# Altium footprint library IC.PcbLib: 386 footprints (part 12 of 30)
Each footprint in its own frame and in the unit in brackets; x right, y up, seen from the top. Pads: shape width x height; smd on the part's side, far side on the other; paste and mask are expansions set on the pad; w line width, h text height; cw(c..) or ccw(c..) is an arc to the next point about the centre after c.
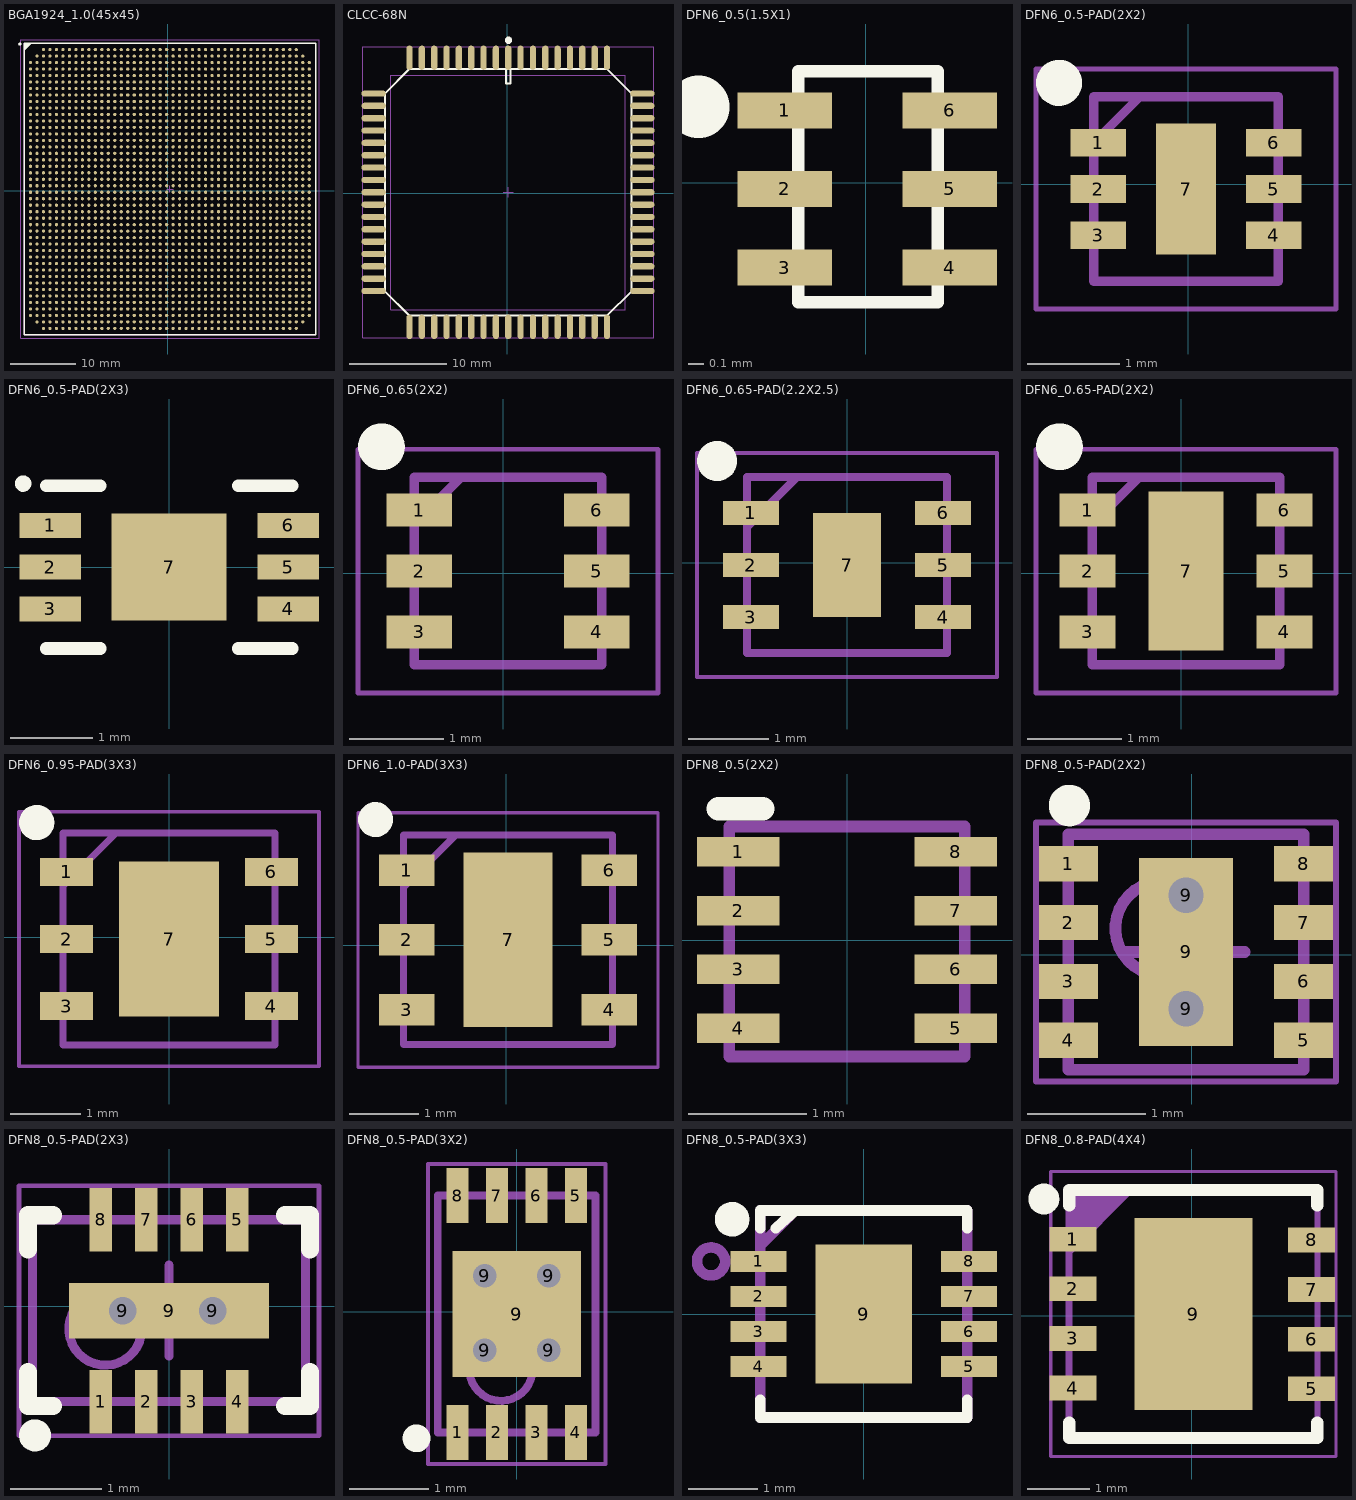
[diagram p11: the footprints below, top view; thin cyan lines are the x and y axes]

## BGA1924_1.0(45x45) [mm]
height 0.65
pads (1924):
  round 0.5 smd: A3(-19.195,21.779) A4(-18.195,21.779) A5(-17.195,21.779) A6(-16.195,21.779) A7(-15.195,21.779) A8(-14.195,21.779) A9(-13.195,21.779) A10(-12.195,21.779) A11(-11.195,21.779) A12(-10.195,21.779) A13(-9.195,21.779) A14(-8.195,21.779) A15(-7.195,21.779) A16(-6.195,21.779) A17(-5.195,21.779) A18(-4.195,21.779) A19(-3.195,21.779) A20(-2.195,21.779) A21(-1.195,21.779) A22(-0.195,21.779) A23(0.805,21.779) A24(1.805,21.779) A25(2.805,21.779) A26(3.805,21.779) A27(4.805,21.779) A28(5.805,21.779) A29(6.805,21.779) A30(7.805,21.779) A31(8.805,21.779) A32(9.805,21.779) A33(10.805,21.779) A34(11.805,21.779) A35(12.805,21.779) A36(13.805,21.779) A37(14.805,21.779) A38(15.805,21.779) A39(16.805,21.779) A40(17.805,21.779) A41(18.805,21.779) A42(19.805,21.779) AA1(-21.195,1.779) AA2(-20.195,1.779) AA3(-19.195,1.779) AA4(-18.195,1.779) AA5(-17.195,1.779) AA6(-16.195,1.779) AA7(-15.195,1.779) AA8(-14.195,1.779) AA9(-13.195,1.779) AA10(-12.195,1.779) AA11(-11.195,1.779) AA12(-10.195,1.779) AA13(-9.195,1.779) AA14(-8.195,1.779) AA15(-7.195,1.779) AA16(-6.195,1.779) AA17(-5.195,1.779) AA18(-4.195,1.779) AA19(-3.195,1.779) AA20(-2.195,1.779) AA21(-1.195,1.779) AA22(-0.195,1.779) AA23(0.805,1.779) AA24(1.805,1.779) AA25(2.805,1.779) AA26(3.805,1.779) AA27(4.805,1.779) AA28(5.805,1.779) AA29(6.805,1.779) AA30(7.805,1.779) AA31(8.805,1.779) AA32(9.805,1.779) AA33(10.805,1.779) AA34(11.805,1.779) AA35(12.805,1.779) AA36(13.805,1.779) AA37(14.805,1.779) AA38(15.805,1.779) AA39(16.805,1.779) AA40(17.805,1.779) AA41(18.805,1.779) AA42(19.805,1.779) AA43(20.805,1.779) AA44(21.805,1.779) AB1(-21.195,0.779) AB2(-20.195,0.779) AB3(-19.195,0.779) AB4(-18.195,0.779) AB5(-17.195,0.779) AB6(-16.195,0.779) AB7(-15.195,0.779) AB8(-14.195,0.779) AB9(-13.195,0.779) AB10(-12.195,0.779) AB11(-11.195,0.779) AB12(-10.195,0.779) AB13(-9.195,0.779) AB14(-8.195,0.779) AB15(-7.195,0.779) AB16(-6.195,0.779) AB17(-5.195,0.779) AB18(-4.195,0.779) AB19(-3.195,0.779) AB20(-2.195,0.779) AB21(-1.195,0.779) AB22(-0.195,0.779) AB23(0.805,0.779) AB24(1.805,0.779) AB25(2.805,0.779) AB26(3.805,0.779) AB27(4.805,0.779) AB28(5.805,0.779) AB29(6.805,0.779) AB30(7.805,0.779) AB31(8.805,0.779) AB32(9.805,0.779) AB33(10.805,0.779) AB34(11.805,0.779) AB35(12.805,0.779) AB36(13.805,0.779) AB37(14.805,0.779) AB38(15.805,0.779) AB39(16.805,0.779) AB40(17.805,0.779) AB41(18.805,0.779) AB42(19.805,0.779) AB43(20.805,0.779) AB44(21.805,0.779) AC1(-21.195,-0.221) AC2(-20.195,-0.221) AC3(-19.195,-0.221) AC4(-18.195,-0.221) AC5(-17.195,-0.221) AC6(-16.195,-0.221) AC7(-15.195,-0.221) AC8(-14.195,-0.221) AC9(-13.195,-0.221) AC10(-12.195,-0.221) AC11(-11.195,-0.221) AC12(-10.195,-0.221) AC13(-9.195,-0.221) AC14(-8.195,-0.221) AC15(-7.195,-0.221) AC16(-6.195,-0.221) AC17(-5.195,-0.221) AC18(-4.195,-0.221) AC19(-3.195,-0.221) AC20(-2.195,-0.221) AC21(-1.195,-0.221) AC22(-0.195,-0.221) AC23(0.805,-0.221) AC24(1.805,-0.221) AC25(2.805,-0.221) AC26(3.805,-0.221) AC27(4.805,-0.221) AC28(5.805,-0.221) AC29(6.805,-0.221) AC30(7.805,-0.221) AC31(8.805,-0.221) AC32(9.805,-0.221) AC33(10.805,-0.221) AC34(11.805,-0.221) AC35(12.805,-0.221) AC36(13.805,-0.221) AC37(14.805,-0.221) AC38(15.805,-0.221) AC39(16.805,-0.221) AC40(17.805,-0.221) AC41(18.805,-0.221) AC42(19.805,-0.221) AC43(20.805,-0.221) AC44(21.805,-0.221) AD1(-21.195,-1.221) AD2(-20.195,-1.221) AD3(-19.195,-1.221) AD4(-18.195,-1.221) AD5(-17.195,-1.221) AD6(-16.195,-1.221) AD7(-15.195,-1.221) AD8(-14.195,-1.221) AD9(-13.195,-1.221) AD10(-12.195,-1.221) AD11(-11.195,-1.221) AD12(-10.195,-1.221) AD13(-9.195,-1.221) AD14(-8.195,-1.221) AD15(-7.195,-1.221) AD16(-6.195,-1.221) AD17(-5.195,-1.221) AD18(-4.195,-1.221) AD19(-3.195,-1.221) AD20(-2.195,-1.221) AD21(-1.195,-1.221) AD22(-0.195,-1.221) AD23(0.805,-1.221) AD24(1.805,-1.221) AD25(2.805,-1.221) AD26(3.805,-1.221) AD27(4.805,-1.221) AD28(5.805,-1.221) AD29(6.805,-1.221) AD30(7.805,-1.221) AD31(8.805,-1.221) AD32(9.805,-1.221) AD33(10.805,-1.221) AD34(11.805,-1.221) AD35(12.805,-1.221) AD36(13.805,-1.221) AD37(14.805,-1.221) AD38(15.805,-1.221) AD39(16.805,-1.221) AD40(17.805,-1.221) AD41(18.805,-1.221) AD42(19.805,-1.221) AD43(20.805,-1.221) AD44(21.805,-1.221) AE1(-21.195,-2.221) AE2(-20.195,-2.221) AE3(-19.195,-2.221) AE4(-18.195,-2.221) AE5(-17.195,-2.221) AE6(-16.195,-2.221) AE7(-15.195,-2.221) AE8(-14.195,-2.221) AE9(-13.195,-2.221) AE10(-12.195,-2.221) AE11(-11.195,-2.221) AE12(-10.195,-2.221) AE13(-9.195,-2.221) AE14(-8.195,-2.221) AE15(-7.195,-2.221) AE16(-6.195,-2.221) AE17(-5.195,-2.221) AE18(-4.195,-2.221) AE19(-3.195,-2.221) AE20(-2.195,-2.221) AE21(-1.195,-2.221) AE22(-0.195,-2.221) AE23(0.805,-2.221) AE24(1.805,-2.221) AE25(2.805,-2.221) AE26(3.805,-2.221) AE27(4.805,-2.221) AE28(5.805,-2.221) AE29(6.805,-2.221) AE30(7.805,-2.221) AE31(8.805,-2.221) AE32(9.805,-2.221) AE33(10.805,-2.221) AE34(11.805,-2.221) AE35(12.805,-2.221) AE36(13.805,-2.221) AE37(14.805,-2.221) AE38(15.805,-2.221) AE39(16.805,-2.221) AE40(17.805,-2.221) AE41(18.805,-2.221) AE42(19.805,-2.221) AE43(20.805,-2.221) AE44(21.805,-2.221) AF1(-21.195,-3.221) AF2(-20.195,-3.221) AF3(-19.195,-3.221) AF4(-18.195,-3.221) AF5(-17.195,-3.221) AF6(-16.195,-3.221) AF7(-15.195,-3.221) AF8(-14.195,-3.221) AF9(-13.195,-3.221) AF10(-12.195,-3.221) AF11(-11.195,-3.221) AF12(-10.195,-3.221) AF13(-9.195,-3.221) AF14(-8.195,-3.221) AF15(-7.195,-3.221) AF16(-6.195,-3.221) AF17(-5.195,-3.221) AF18(-4.195,-3.221) AF19(-3.195,-3.221) AF20(-2.195,-3.221) AF21(-1.195,-3.221) AF22(-0.195,-3.221) AF23(0.805,-3.221) AF24(1.805,-3.221) AF25(2.805,-3.221) AF26(3.805,-3.221) AF27(4.805,-3.221) AF28(5.805,-3.221) AF29(6.805,-3.221) AF30(7.805,-3.221) AF31(8.805,-3.221) AF32(9.805,-3.221) AF33(10.805,-3.221) AF34(11.805,-3.221) AF35(12.805,-3.221) AF36(13.805,-3.221) AF37(14.805,-3.221) AF38(15.805,-3.221) AF39(16.805,-3.221) AF40(17.805,-3.221) AF41(18.805,-3.221) AF42(19.805,-3.221) AF43(20.805,-3.221) AF44(21.805,-3.221) AG1(-21.195,-4.221) AG2(-20.195,-4.221) AG3(-19.195,-4.221) AG4(-18.195,-4.221) AG5(-17.195,-4.221) AG6(-16.195,-4.221) AG7(-15.195,-4.221) AG8(-14.195,-4.221) AG9(-13.195,-4.221) AG10(-12.195,-4.221) AG11(-11.195,-4.221) AG12(-10.195,-4.221) AG13(-9.195,-4.221) AG14(-8.195,-4.221) AG15(-7.195,-4.221) AG16(-6.195,-4.221) AG17(-5.195,-4.221) AG18(-4.195,-4.221) AG19(-3.195,-4.221) AG20(-2.195,-4.221) AG21(-1.195,-4.221) AG22(-0.195,-4.221) AG23(0.805,-4.221) AG24(1.805,-4.221) AG25(2.805,-4.221) AG26(3.805,-4.221) AG27(4.805,-4.221) AG28(5.805,-4.221) AG29(6.805,-4.221) AG30(7.805,-4.221) AG31(8.805,-4.221) AG32(9.805,-4.221) AG33(10.805,-4.221) AG34(11.805,-4.221) AG35(12.805,-4.221) AG36(13.805,-4.221) AG37(14.805,-4.221) AG38(15.805,-4.221) AG39(16.805,-4.221) AG40(17.805,-4.221) AG41(18.805,-4.221) AG42(19.805,-4.221) AG43(20.805,-4.221) AG44(21.805,-4.221) AH1(-21.195,-5.221) AH2(-20.195,-5.221) AH3(-19.195,-5.221) AH4(-18.195,-5.221) AH5(-17.195,-5.221) AH6(-16.195,-5.221) AH7(-15.195,-5.221) AH8(-14.195,-5.221) AH9(-13.195,-5.221) AH10(-12.195,-5.221) AH11(-11.195,-5.221) AH12(-10.195,-5.221) AH13(-9.195,-5.221) AH14(-8.195,-5.221) AH15(-7.195,-5.221) AH16(-6.195,-5.221) AH17(-5.195,-5.221) AH18(-4.195,-5.221) AH19(-3.195,-5.221) AH20(-2.195,-5.221) AH21(-1.195,-5.221) AH22(-0.195,-5.221) AH23(0.805,-5.221) AH24(1.805,-5.221) AH25(2.805,-5.221) AH26(3.805,-5.221) AH27(4.805,-5.221) AH28(5.805,-5.221) AH29(6.805,-5.221) AH30(7.805,-5.221) AH31(8.805,-5.221) AH32(9.805,-5.221) AH33(10.805,-5.221) AH34(11.805,-5.221) AH35(12.805,-5.221) AH36(13.805,-5.221) AH37(14.805,-5.221) AH38(15.805,-5.221) AH39(16.805,-5.221) AH40(17.805,-5.221) AH41(18.805,-5.221) AH42(19.805,-5.221) AH43(20.805,-5.221) AH44(21.805,-5.221) AJ1(-21.195,-6.221) AJ2(-20.195,-6.221) AJ3(-19.195,-6.221) AJ4(-18.195,-6.221) AJ5(-17.195,-6.221) AJ6(-16.195,-6.221) AJ7(-15.195,-6.221) AJ8(-14.195,-6.221) AJ9(-13.195,-6.221) AJ10(-12.195,-6.221) AJ11(-11.195,-6.221) AJ12(-10.195,-6.221) AJ13(-9.195,-6.221) AJ14(-8.195,-6.221) AJ15(-7.195,-6.221) AJ16(-6.195,-6.221) AJ17(-5.195,-6.221) AJ18(-4.195,-6.221) AJ19(-3.195,-6.221) AJ20(-2.195,-6.221) AJ21(-1.195,-6.221) AJ22(-0.195,-6.221) AJ23(0.805,-6.221) AJ24(1.805,-6.221) AJ25(2.805,-6.221) AJ26(3.805,-6.221) AJ27(4.805,-6.221) AJ28(5.805,-6.221) AJ29(6.805,-6.221) AJ30(7.805,-6.221) AJ31(8.805,-6.221) AJ32(9.805,-6.221) AJ33(10.805,-6.221) AJ34(11.805,-6.221) AJ35(12.805,-6.221) AJ36(13.805,-6.221) AJ37(14.805,-6.221) AJ38(15.805,-6.221) AJ39(16.805,-6.221) AJ40(17.805,-6.221) AJ41(18.805,-6.221) AJ42(19.805,-6.221) AJ43(20.805,-6.221) AJ44(21.805,-6.221) AK1(-21.195,-7.221) AK2(-20.195,-7.221) AK3(-19.195,-7.221) AK4(-18.195,-7.221) AK5(-17.195,-7.221) AK6(-16.195,-7.221) AK7(-15.195,-7.221) AK8(-14.195,-7.221) AK9(-13.195,-7.221) AK10(-12.195,-7.221) AK11(-11.195,-7.221) AK12(-10.195,-7.221) AK13(-9.195,-7.221) AK14(-8.195,-7.221) AK15(-7.195,-7.221) AK16(-6.195,-7.221) AK17(-5.195,-7.221) AK18(-4.195,-7.221) AK19(-3.195,-7.221) AK20(-2.195,-7.221) AK21(-1.195,-7.221) AK22(-0.195,-7.221) AK23(0.805,-7.221) AK24(1.805,-7.221) AK25(2.805,-7.221) AK26(3.805,-7.221) AK27(4.805,-7.221) AK28(5.805,-7.221) AK29(6.805,-7.221) AK30(7.805,-7.221) AK31(8.805,-7.221) AK32(9.805,-7.221) AK33(10.805,-7.221) AK34(11.805,-7.221) AK35(12.805,-7.221) AK36(13.805,-7.221) AK37(14.805,-7.221) AK38(15.805,-7.221) AK39(16.805,-7.221) AK40(17.805,-7.221) AK41(18.805,-7.221) AK42(19.805,-7.221) AK43(20.805,-7.221) AK44(21.805,-7.221) AL1(-21.195,-8.221) AL2(-20.195,-8.221) AL3(-19.195,-8.221) AL4(-18.195,-8.221) AL5(-17.195,-8.221) AL6(-16.195,-8.221) AL7(-15.195,-8.221) AL8(-14.195,-8.221) AL9(-13.195,-8.221) AL10(-12.195,-8.221) AL11(-11.195,-8.221) AL12(-10.195,-8.221) AL13(-9.195,-8.221) AL14(-8.195,-8.221) AL15(-7.195,-8.221) AL16(-6.195,-8.221) AL17(-5.195,-8.221) AL18(-4.195,-8.221) AL19(-3.195,-8.221) AL20(-2.195,-8.221) AL21(-1.195,-8.221) AL22(-0.195,-8.221) AL23(0.805,-8.221) AL24(1.805,-8.221) AL25(2.805,-8.221) AL26(3.805,-8.221) AL27(4.805,-8.221) AL28(5.805,-8.221) AL29(6.805,-8.221) AL30(7.805,-8.221) AL31(8.805,-8.221) AL32(9.805,-8.221) AL33(10.805,-8.221) AL34(11.805,-8.221) AL35(12.805,-8.221) AL36(13.805,-8.221) AL37(14.805,-8.221) AL38(15.805,-8.221) AL39(16.805,-8.221) AL40(17.805,-8.221) AL41(18.805,-8.221) AL42(19.805,-8.221) AL43(20.805,-8.221) AL44(21.805,-8.221) AM1(-21.195,-9.221) AM2(-20.195,-9.221) AM3(-19.195,-9.221) AM4(-18.195,-9.221) AM5(-17.195,-9.221) AM6(-16.195,-9.221) AM7(-15.195,-9.221) AM8(-14.195,-9.221) AM9(-13.195,-9.221) AM10(-12.195,-9.221) AM11(-11.195,-9.221) AM12(-10.195,-9.221) AM13(-9.195,-9.221) AM14(-8.195,-9.221) AM15(-7.195,-9.221) AM16(-6.195,-9.221) AM17(-5.195,-9.221) AM18(-4.195,-9.221) AM19(-3.195,-9.221) AM20(-2.195,-9.221) AM21(-1.195,-9.221) AM22(-0.195,-9.221) AM23(0.805,-9.221) AM24(1.805,-9.221) AM25(2.805,-9.221) AM26(3.805,-9.221) AM27(4.805,-9.221) AM28(5.805,-9.221) AM29(6.805,-9.221) AM30(7.805,-9.221) AM31(8.805,-9.221) AM32(9.805,-9.221) AM33(10.805,-9.221) AM34(11.805,-9.221) AM35(12.805,-9.221) AM36(13.805,-9.221) AM37(14.805,-9.221) AM38(15.805,-9.221) AM39(16.805,-9.221) AM40(17.805,-9.221) AM41(18.805,-9.221) AM42(19.805,-9.221) AM43(20.805,-9.221) AM44(21.805,-9.221) AN1(-21.195,-10.221) AN2(-20.195,-10.221) AN3(-19.195,-10.221) AN4(-18.195,-10.221) AN5(-17.195,-10.221) AN6(-16.195,-10.221) AN7(-15.195,-10.221) AN8(-14.195,-10.221) AN9(-13.195,-10.221) AN10(-12.195,-10.221) AN11(-11.195,-10.221) AN12(-10.195,-10.221) AN13(-9.195,-10.221) AN14(-8.195,-10.221) AN15(-7.195,-10.221) AN16(-6.195,-10.221) AN17(-5.195,-10.221) AN18(-4.195,-10.221) AN19(-3.195,-10.221) AN20(-2.195,-10.221) AN21(-1.195,-10.221) AN22(-0.195,-10.221) AN23(0.805,-10.221) AN24(1.805,-10.221) AN25(2.805,-10.221) AN26(3.805,-10.221) AN27(4.805,-10.221) AN28(5.805,-10.221) AN29(6.805,-10.221) AN30(7.805,-10.221) AN31(8.805,-10.221) AN32(9.805,-10.221) AN33(10.805,-10.221) AN34(11.805,-10.221) AN35(12.805,-10.221) AN36(13.805,-10.221) AN37(14.805,-10.221) AN38(15.805,-10.221) AN39(16.805,-10.221) AN40(17.805,-10.221) AN41(18.805,-10.221) AN42(19.805,-10.221) AN43(20.805,-10.221) AN44(21.805,-10.221) AP1(-21.195,-11.221) AP2(-20.195,-11.221) AP3(-19.195,-11.221) AP4(-18.195,-11.221) AP5(-17.195,-11.221) AP6(-16.195,-11.221) AP7(-15.195,-11.221) AP8(-14.195,-11.221) AP9(-13.195,-11.221) AP10(-12.195,-11.221) AP11(-11.195,-11.221) AP12(-10.195,-11.221) AP13(-9.195,-11.221) AP14(-8.195,-11.221) AP15(-7.195,-11.221) AP16(-6.195,-11.221) AP17(-5.195,-11.221) AP18(-4.195,-11.221) AP19(-3.195,-11.221) AP20(-2.195,-11.221) AP21(-1.195,-11.221) AP22(-0.195,-11.221) AP23(0.805,-11.221) AP24(1.805,-11.221) AP25(2.805,-11.221) AP26(3.805,-11.221) AP27(4.805,-11.221) AP28(5.805,-11.221) AP29(6.805,-11.221) AP30(7.805,-11.221) AP31(8.805,-11.221) AP32(9.805,-11.221) AP33(10.805,-11.221) AP34(11.805,-11.221) AP35(12.805,-11.221) AP36(13.805,-11.221) AP37(14.805,-11.221) AP38(15.805,-11.221) AP39(16.805,-11.221) AP40(17.805,-11.221) AP41(18.805,-11.221) AP42(19.805,-11.221) AP43(20.805,-11.221) AP44(21.805,-11.221) AR1(-21.195,-12.221) AR2(-20.195,-12.221) AR3(-19.195,-12.221) AR4(-18.195,-12.221) AR5(-17.195,-12.221) AR6(-16.195,-12.221) AR7(-15.195,-12.221) AR8(-14.195,-12.221) AR9(-13.195,-12.221) AR10(-12.195,-12.221) AR11(-11.195,-12.221) AR12(-10.195,-12.221) AR13(-9.195,-12.221) AR14(-8.195,-12.221) AR15(-7.195,-12.221) AR16(-6.195,-12.221) AR17(-5.195,-12.221) AR18(-4.195,-12.221) AR19(-3.195,-12.221) AR20(-2.195,-12.221) AR21(-1.195,-12.221) AR22(-0.195,-12.221) AR23(0.805,-12.221) AR24(1.805,-12.221) AR25(2.805,-12.221) AR26(3.805,-12.221) AR27(4.805,-12.221) AR28(5.805,-12.221) AR29(6.805,-12.221) AR30(7.805,-12.221) AR31(8.805,-12.221) AR32(9.805,-12.221) AR33(10.805,-12.221) AR34(11.805,-12.221) AR35(12.805,-12.221) AR36(13.805,-12.221) AR37(14.805,-12.221) AR38(15.805,-12.221) AR39(16.805,-12.221) AR40(17.805,-12.221) AR41(18.805,-12.221) AR42(19.805,-12.221) AR43(20.805,-12.221) AR44(21.805,-12.221) AT1(-21.195,-13.221) AT2(-20.195,-13.221) AT3(-19.195,-13.221) AT4(-18.195,-13.221) AT5(-17.195,-13.221) AT6(-16.195,-13.221) AT7(-15.195,-13.221) AT8(-14.195,-13.221) AT9(-13.195,-13.221) AT10(-12.195,-13.221) AT11(-11.195,-13.221) AT12(-10.195,-13.221) AT13(-9.195,-13.221) AT14(-8.195,-13.221) AT15(-7.195,-13.221) AT16(-6.195,-13.221) AT17(-5.195,-13.221) AT18(-4.195,-13.221) AT19(-3.195,-13.221) AT20(-2.195,-13.221) AT21(-1.195,-13.221) AT22(-0.195,-13.221) AT23(0.805,-13.221) AT24(1.805,-13.221) AT25(2.805,-13.221) AT26(3.805,-13.221) AT27(4.805,-13.221) AT28(5.805,-13.221) AT29(6.805,-13.221) AT30(7.805,-13.221) AT31(8.805,-13.221) AT32(9.805,-13.221) AT33(10.805,-13.221) AT34(11.805,-13.221) AT35(12.805,-13.221) AT36(13.805,-13.221) AT37(14.805,-13.221) AT38(15.805,-13.221) AT39(16.805,-13.221) AT40(17.805,-13.221) AT41(18.805,-13.221) AT42(19.805,-13.221) AT43(20.805,-13.221) AT44(21.805,-13.221) AU1(-21.195,-14.221) AU2(-20.195,-14.221) AU3(-19.195,-14.221) AU4(-18.195,-14.221) AU5(-17.195,-14.221) AU6(-16.195,-14.221) AU7(-15.195,-14.221) AU8(-14.195,-14.221) AU9(-13.195,-14.221) AU10(-12.195,-14.221) AU11(-11.195,-14.221) AU12(-10.195,-14.221) AU13(-9.195,-14.221) AU14(-8.195,-14.221) AU15(-7.195,-14.221) AU16(-6.195,-14.221) AU17(-5.195,-14.221) AU18(-4.195,-14.221) AU19(-3.195,-14.221) AU20(-2.195,-14.221) AU21(-1.195,-14.221) AU22(-0.195,-14.221) AU23(0.805,-14.221) AU24(1.805,-14.221) AU25(2.805,-14.221) AU26(3.805,-14.221) AU27(4.805,-14.221) AU28(5.805,-14.221) AU29(6.805,-14.221) AU30(7.805,-14.221) AU31(8.805,-14.221) AU32(9.805,-14.221) AU33(10.805,-14.221) AU34(11.805,-14.221) AU35(12.805,-14.221) AU36(13.805,-14.221) AU37(14.805,-14.221) AU38(15.805,-14.221) AU39(16.805,-14.221) AU40(17.805,-14.221) AU41(18.805,-14.221) AU42(19.805,-14.221) AU43(20.805,-14.221) AU44(21.805,-14.221) AV1(-21.195,-15.221) AV2(-20.195,-15.221) AV3(-19.195,-15.221) AV4(-18.195,-15.221) AV5(-17.195,-15.221) AV6(-16.195,-15.221) AV7(-15.195,-15.221) AV8(-14.195,-15.221) AV9(-13.195,-15.221) AV10(-12.195,-15.221) AV11(-11.195,-15.221) AV12(-10.195,-15.221) AV13(-9.195,-15.221) AV14(-8.195,-15.221) AV15(-7.195,-15.221) AV16(-6.195,-15.221) AV17(-5.195,-15.221) AV18(-4.195,-15.221) AV19(-3.195,-15.221) AV20(-2.195,-15.221) AV21(-1.195,-15.221) AV22(-0.195,-15.221) AV23(0.805,-15.221) AV24(1.805,-15.221) AV25(2.805,-15.221) AV26(3.805,-15.221) AV27(4.805,-15.221) AV28(5.805,-15.221) AV29(6.805,-15.221) AV30(7.805,-15.221) AV31(8.805,-15.221) AV32(9.805,-15.221) AV33(10.805,-15.221) AV34(11.805,-15.221) AV35(12.805,-15.221) AV36(13.805,-15.221) AV37(14.805,-15.221) AV38(15.805,-15.221) AV39(16.805,-15.221) AV40(17.805,-15.221) AV41(18.805,-15.221) AV42(19.805,-15.221) AV43(20.805,-15.221) AV44(21.805,-15.221) AW1(-21.195,-16.221) AW2(-20.195,-16.221) AW3(-19.195,-16.221) AW4(-18.195,-16.221) AW5(-17.195,-16.221) AW6(-16.195,-16.221) AW7(-15.195,-16.221) AW8(-14.195,-16.221) AW9(-13.195,-16.221) AW10(-12.195,-16.221) AW11(-11.195,-16.221) AW12(-10.195,-16.221) AW13(-9.195,-16.221) AW14(-8.195,-16.221) AW15(-7.195,-16.221) AW16(-6.195,-16.221) AW17(-5.195,-16.221) AW18(-4.195,-16.221) AW19(-3.195,-16.221) AW20(-2.195,-16.221) AW21(-1.195,-16.221) AW22(-0.195,-16.221) AW23(0.805,-16.221) AW24(1.805,-16.221) AW25(2.805,-16.221) AW26(3.805,-16.221) AW27(4.805,-16.221) AW28(5.805,-16.221) AW29(6.805,-16.221) AW30(7.805,-16.221) AW31(8.805,-16.221) AW32(9.805,-16.221) AW33(10.805,-16.221) AW34(11.805,-16.221) AW35(12.805,-16.221) AW36(13.805,-16.221) AW37(14.805,-16.221) AW38(15.805,-16.221) AW39(16.805,-16.221) AW40(17.805,-16.221) AW41(18.805,-16.221) AW42(19.805,-16.221) AW43(20.805,-16.221) AW44(21.805,-16.221) AY1(-21.195,-17.221) AY2(-20.195,-17.221) AY3(-19.195,-17.221) AY4(-18.195,-17.221) AY5(-17.195,-17.221) AY6(-16.195,-17.221) AY7(-15.195,-17.221) AY8(-14.195,-17.221) AY9(-13.195,-17.221) AY10(-12.195,-17.221) AY11(-11.195,-17.221) AY12(-10.195,-17.221) AY13(-9.195,-17.221) AY14(-8.195,-17.221) AY15(-7.195,-17.221) AY16(-6.195,-17.221) AY17(-5.195,-17.221) AY18(-4.195,-17.221) AY19(-3.195,-17.221) AY20(-2.195,-17.221) AY21(-1.195,-17.221) AY22(-0.195,-17.221) AY23(0.805,-17.221) AY24(1.805,-17.221) AY25(2.805,-17.221) AY26(3.805,-17.221) AY27(4.805,-17.221) AY28(5.805,-17.221) AY29(6.805,-17.221) AY30(7.805,-17.221) AY31(8.805,-17.221) AY32(9.805,-17.221) AY33(10.805,-17.221) AY34(11.805,-17.221) AY35(12.805,-17.221) AY36(13.805,-17.221) AY37(14.805,-17.221) AY38(15.805,-17.221) AY39(16.805,-17.221) AY40(17.805,-17.221) AY41(18.805,-17.221) AY42(19.805,-17.221) AY43(20.805,-17.221) AY44(21.805,-17.221) B2(-20.195,20.779) B3(-19.195,20.779) B4(-18.195,20.779) B5(-17.195,20.779) B6(-16.195,20.779) B7(-15.195,20.779) B8(-14.195,20.779) B9(-13.195,20.779) B10(-12.195,20.779) B11(-11.195,20.779) B12(-10.195,20.779) B13(-9.195,20.779) B14(-8.195,20.779) B15(-7.195,20.779) B16(-6.195,20.779) B17(-5.195,20.779) B18(-4.195,20.779) B19(-3.195,20.779) B20(-2.195,20.779) B21(-1.195,20.779) B22(-0.195,20.779) B23(0.805,20.779) B24(1.805,20.779) B25(2.805,20.779) B26(3.805,20.779) B27(4.805,20.779) B28(5.805,20.779) B29(6.805,20.779) B30(7.805,20.779) B31(8.805,20.779) B32(9.805,20.779) B33(10.805,20.779) B34(11.805,20.779) B35(12.805,20.779) B36(13.805,20.779) B37(14.805,20.779) B38(15.805,20.779) B39(16.805,20.779) B40(17.805,20.779) B41(18.805,20.779) B42(19.805,20.779) B43(20.805,20.779) BA1(-21.195,-18.221) BA2(-20.195,-18.221) BA3(-19.195,-18.221) BA4(-18.195,-18.221) BA5(-17.195,-18.221) BA6(-16.195,-18.221) BA7(-15.195,-18.221) BA8(-14.195,-18.221) BA9(-13.195,-18.221) BA10(-12.195,-18.221) BA11(-11.195,-18.221) BA12(-10.195,-18.221) BA13(-9.195,-18.221) BA14(-8.195,-18.221) BA15(-7.195,-18.221) BA16(-6.195,-18.221) BA17(-5.195,-18.221) BA18(-4.195,-18.221) BA19(-3.195,-18.221) BA20(-2.195,-18.221) BA21(-1.195,-18.221) BA22(-0.195,-18.221) BA23(0.805,-18.221) BA24(1.805,-18.221) BA25(2.805,-18.221) BA26(3.805,-18.221) BA27(4.805,-18.221) BA28(5.805,-18.221) BA29(6.805,-18.221) BA30(7.805,-18.221) BA31(8.805,-18.221) BA32(9.805,-18.221) BA33(10.805,-18.221) BA34(11.805,-18.221) BA35(12.805,-18.221) BA36(13.805,-18.221) BA37(14.805,-18.221) BA38(15.805,-18.221) BA39(16.805,-18.221) BA40(17.805,-18.221) BA41(18.805,-18.221) BA42(19.805,-18.221) BA43(20.805,-18.221) BA44(21.805,-18.221) BB1(-21.195,-19.221) BB2(-20.195,-19.221) BB3(-19.195,-19.221) BB4(-18.195,-19.221) BB5(-17.195,-19.221) BB6(-16.195,-19.221) BB7(-15.195,-19.221) BB8(-14.195,-19.221) BB9(-13.195,-19.221) BB10(-12.195,-19.221) BB11(-11.195,-19.221) BB12(-10.195,-19.221) BB13(-9.195,-19.221) BB14(-8.195,-19.221) BB15(-7.195,-19.221) BB16(-6.195,-19.221) BB17(-5.195,-19.221) BB18(-4.195,-19.221) BB19(-3.195,-19.221) BB20(-2.195,-19.221) BB21(-1.195,-19.221) BB22(-0.195,-19.221) BB23(0.805,-19.221) BB24(1.805,-19.221) BB25(2.805,-19.221) BB26(3.805,-19.221) BB27(4.805,-19.221) BB28(5.805,-19.221) BB29(6.805,-19.221) BB30(7.805,-19.221) BB31(8.805,-19.221) BB32(9.805,-19.221) BB33(10.805,-19.221) BB34(11.805,-19.221) BB35(12.805,-19.221) BB36(13.805,-19.221) BB37(14.805,-19.221) BB38(15.805,-19.221) BB39(16.805,-19.221) BB40(17.805,-19.221) BB41(18.805,-19.221) BB42(19.805,-19.221) BB43(20.805,-19.221) BB44(21.805,-19.221) BC2(-20.195,-20.221) BC3(-19.195,-20.221) BC4(-18.195,-20.221) BC5(-17.195,-20.221) BC6(-16.195,-20.221) BC7(-15.195,-20.221) BC8(-14.195,-20.221) BC9(-13.195,-20.221) BC10(-12.195,-20.221) BC11(-11.195,-20.221) BC12(-10.195,-20.221) BC13(-9.195,-20.221) BC14(-8.195,-20.221) BC15(-7.195,-20.221) BC16(-6.195,-20.221) BC17(-5.195,-20.221) BC18(-4.195,-20.221) BC19(-3.195,-20.221) BC20(-2.195,-20.221) BC21(-1.195,-20.221) BC22(-0.195,-20.221) BC23(0.805,-20.221) BC24(1.805,-20.221) BC25(2.805,-20.221) BC26(3.805,-20.221) BC27(4.805,-20.221) BC28(5.805,-20.221) BC29(6.805,-20.221) BC30(7.805,-20.221) BC31(8.805,-20.221) BC32(9.805,-20.221) BC33(10.805,-20.221) BC34(11.805,-20.221) BC35(12.805,-20.221) BC36(13.805,-20.221) BC37(14.805,-20.221) BC38(15.805,-20.221) BC39(16.805,-20.221) BC40(17.805,-20.221) BC41(18.805,-20.221) BC42(19.805,-20.221) BC43(20.805,-20.221) BD3(-19.195,-21.221) BD4(-18.195,-21.221) BD5(-17.195,-21.221) BD6(-16.195,-21.221) BD7(-15.195,-21.221) BD8(-14.195,-21.221) BD9(-13.195,-21.221) BD10(-12.195,-21.221) BD11(-11.195,-21.221) BD12(-10.195,-21.221) BD13(-9.195,-21.221) BD14(-8.195,-21.221) BD15(-7.195,-21.221) BD16(-6.195,-21.221) BD17(-5.195,-21.221) BD18(-4.195,-21.221) BD19(-3.195,-21.221) BD20(-2.195,-21.221) BD21(-1.195,-21.221) BD22(-0.195,-21.221) BD23(0.805,-21.221) BD24(1.805,-21.221) BD25(2.805,-21.221) BD26(3.805,-21.221) BD27(4.805,-21.221) BD28(5.805,-21.221) BD29(6.805,-21.221) BD30(7.805,-21.221) BD31(8.805,-21.221) BD32(9.805,-21.221) BD33(10.805,-21.221) BD34(11.805,-21.221) BD35(12.805,-21.221) BD36(13.805,-21.221) BD37(14.805,-21.221) BD38(15.805,-21.221) BD39(16.805,-21.221) BD40(17.805,-21.221) BD41(18.805,-21.221) BD42(19.805,-21.221) C1(-21.195,19.779) C2(-20.195,19.779) C3(-19.195,19.779) C4(-18.195,19.779) C5(-17.195,19.779) C6(-16.195,19.779) C7(-15.195,19.779) C8(-14.195,19.779) C9(-13.195,19.779) C10(-12.195,19.779) C11(-11.195,19.779) C12(-10.195,19.779) C13(-9.195,19.779) C14(-8.195,19.779) C15(-7.195,19.779) C16(-6.195,19.779) C17(-5.195,19.779) C18(-4.195,19.779) C19(-3.195,19.779) C20(-2.195,19.779) C21(-1.195,19.779) C22(-0.195,19.779) C23(0.805,19.779) C24(1.805,19.779) C25(2.805,19.779) C26(3.805,19.779) C27(4.805,19.779) C28(5.805,19.779) C29(6.805,19.779) C30(7.805,19.779) C31(8.805,19.779) C32(9.805,19.779) C33(10.805,19.779) C34(11.805,19.779) C35(12.805,19.779) C36(13.805,19.779) C37(14.805,19.779) C38(15.805,19.779) C39(16.805,19.779) C40(17.805,19.779) C41(18.805,19.779) C42(19.805,19.779) C43(20.805,19.779) C44(21.805,19.779) D1(-21.195,18.779) D2(-20.195,18.779) D3(-19.195,18.779) D4(-18.195,18.779) D5(-17.195,18.779) D6(-16.195,18.779) D7(-15.195,18.779) D8(-14.195,18.779) D9(-13.195,18.779) D10(-12.195,18.779) D11(-11.195,18.779) D12(-10.195,18.779) D13(-9.195,18.779) D14(-8.195,18.779) D15(-7.195,18.779) D16(-6.195,18.779) D17(-5.195,18.779) D18(-4.195,18.779) D19(-3.195,18.779) D20(-2.195,18.779) D21(-1.195,18.779) D22(-0.195,18.779) D23(0.805,18.779) D24(1.805,18.779) D25(2.805,18.779) D26(3.805,18.779) D27(4.805,18.779) D28(5.805,18.779) D29(6.805,18.779) D30(7.805,18.779) D31(8.805,18.779) D32(9.805,18.779) D33(10.805,18.779) D34(11.805,18.779) D35(12.805,18.779) D36(13.805,18.779) D37(14.805,18.779) D38(15.805,18.779) D39(16.805,18.779) D40(17.805,18.779) D41(18.805,18.779) D42(19.805,18.779) D43(20.805,18.779) D44(21.805,18.779) E1(-21.195,17.779) E2(-20.195,17.779) E3(-19.195,17.779) E4(-18.195,17.779) E5(-17.195,17.779) E6(-16.195,17.779) E7(-15.195,17.779) E8(-14.195,17.779) E9(-13.195,17.779) E10(-12.195,17.779) E11(-11.195,17.779) E12(-10.195,17.779) E13(-9.195,17.779) E14(-8.195,17.779) E15(-7.195,17.779) E16(-6.195,17.779) E17(-5.195,17.779) E18(-4.195,17.779) E19(-3.195,17.779) E20(-2.195,17.779) E21(-1.195,17.779) E22(-0.195,17.779) E23(0.805,17.779) E24(1.805,17.779) E25(2.805,17.779) E26(3.805,17.779) E27(4.805,17.779) E28(5.805,17.779) E29(6.805,17.779) E30(7.805,17.779) E31(8.805,17.779) E32(9.805,17.779) E33(10.805,17.779) E34(11.805,17.779) E35(12.805,17.779) E36(13.805,17.779) E37(14.805,17.779) E38(15.805,17.779) E39(16.805,17.779) E40(17.805,17.779) E41(18.805,17.779) E42(19.805,17.779) E43(20.805,17.779) E44(21.805,17.779) F1(-21.195,16.779) F2(-20.195,16.779) F3(-19.195,16.779) F4(-18.195,16.779) F5(-17.195,16.779) F6(-16.195,16.779) F7(-15.195,16.779) F8(-14.195,16.779) F9(-13.195,16.779) F10(-12.195,16.779) F11(-11.195,16.779) F12(-10.195,16.779) F13(-9.195,16.779) F14(-8.195,16.779) F15(-7.195,16.779) F16(-6.195,16.779) F17(-5.195,16.779) F18(-4.195,16.779) F19(-3.195,16.779) F20(-2.195,16.779) F21(-1.195,16.779) F22(-0.195,16.779) F23(0.805,16.779) F24(1.805,16.779) F25(2.805,16.779) F26(3.805,16.779) F27(4.805,16.779) F28(5.805,16.779) F29(6.805,16.779) F30(7.805,16.779) F31(8.805,16.779) F32(9.805,16.779) F33(10.805,16.779) F34(11.805,16.779) F35(12.805,16.779) F36(13.805,16.779) F37(14.805,16.779) F38(15.805,16.779) F39(16.805,16.779) F40(17.805,16.779) F41(18.805,16.779) F42(19.805,16.779) F43(20.805,16.779) F44(21.805,16.779) G1(-21.195,15.779) G2(-20.195,15.779) G3(-19.195,15.779) G4(-18.195,15.779) G5(-17.195,15.779) G6(-16.195,15.779) G7(-15.195,15.779) G8(-14.195,15.779) G9(-13.195,15.779) G10(-12.195,15.779) G11(-11.195,15.779) G12(-10.195,15.779) G13(-9.195,15.779) G14(-8.195,15.779) G15(-7.195,15.779) G16(-6.195,15.779) G17(-5.195,15.779) G18(-4.195,15.779) G19(-3.195,15.779) G20(-2.195,15.779) G21(-1.195,15.779) G22(-0.195,15.779) G23(0.805,15.779) G24(1.805,15.779) G25(2.805,15.779) G26(3.805,15.779) G27(4.805,15.779) G28(5.805,15.779) G29(6.805,15.779) G30(7.805,15.779) G31(8.805,15.779) G32(9.805,15.779) G33(10.805,15.779) G34(11.805,15.779) G35(12.805,15.779) G36(13.805,15.779) G37(14.805,15.779) G38(15.805,15.779) G39(16.805,15.779) G40(17.805,15.779) G41(18.805,15.779) G42(19.805,15.779) G43(20.805,15.779) G44(21.805,15.779) H1(-21.195,14.779) H2(-20.195,14.779) H3(-19.195,14.779) H4(-18.195,14.779) H5(-17.195,14.779) H6(-16.195,14.779) H7(-15.195,14.779) H8(-14.195,14.779) H9(-13.195,14.779) H10(-12.195,14.779) H11(-11.195,14.779) H12(-10.195,14.779) H13(-9.195,14.779) H14(-8.195,14.779) H15(-7.195,14.779) H16(-6.195,14.779) H17(-5.195,14.779) H18(-4.195,14.779) H19(-3.195,14.779) H20(-2.195,14.779) H21(-1.195,14.779) H22(-0.195,14.779) H23(0.805,14.779) H24(1.805,14.779) H25(2.805,14.779) H26(3.805,14.779) H27(4.805,14.779) H28(5.805,14.779) H29(6.805,14.779) H30(7.805,14.779) H31(8.805,14.779) H32(9.805,14.779) H33(10.805,14.779) H34(11.805,14.779) H35(12.805,14.779) H36(13.805,14.779) H37(14.805,14.779) H38(15.805,14.779) H39(16.805,14.779) H40(17.805,14.779) H41(18.805,14.779) H42(19.805,14.779) H43(20.805,14.779) H44(21.805,14.779) J1(-21.195,13.779) J2(-20.195,13.779) J3(-19.195,13.779) J4(-18.195,13.779) J5(-17.195,13.779) J6(-16.195,13.779) J7(-15.195,13.779) J8(-14.195,13.779) J9(-13.195,13.779) J10(-12.195,13.779) J11(-11.195,13.779) J12(-10.195,13.779) J13(-9.195,13.779) J14(-8.195,13.779) J15(-7.195,13.779) J16(-6.195,13.779) J17(-5.195,13.779) J18(-4.195,13.779) J19(-3.195,13.779) J20(-2.195,13.779) J21(-1.195,13.779) J22(-0.195,13.779) J23(0.805,13.779) J24(1.805,13.779) J25(2.805,13.779) J26(3.805,13.779) J27(4.805,13.779) J28(5.805,13.779) J29(6.805,13.779) J30(7.805,13.779) J31(8.805,13.779) J32(9.805,13.779) J33(10.805,13.779) J34(11.805,13.779) J35(12.805,13.779) J36(13.805,13.779) J37(14.805,13.779) J38(15.805,13.779) J39(16.805,13.779) J40(17.805,13.779) J41(18.805,13.779) J42(19.805,13.779) J43(20.805,13.779) J44(21.805,13.779) K1(-21.195,12.779) K2(-20.195,12.779) K3(-19.195,12.779) K4(-18.195,12.779) K5(-17.195,12.779) K6(-16.195,12.779) K7(-15.195,12.779) K8(-14.195,12.779) K9(-13.195,12.779) K10(-12.195,12.779) K11(-11.195,12.779) K12(-10.195,12.779) K13(-9.195,12.779) K14(-8.195,12.779) K15(-7.195,12.779) K16(-6.195,12.779) K17(-5.195,12.779) K18(-4.195,12.779) K19(-3.195,12.779) K20(-2.195,12.779) K21(-1.195,12.779) K22(-0.195,12.779) K23(0.805,12.779) K24(1.805,12.779) K25(2.805,12.779) K26(3.805,12.779) K27(4.805,12.779) K28(5.805,12.779) K29(6.805,12.779) K30(7.805,12.779) K31(8.805,12.779) K32(9.805,12.779) K33(10.805,12.779) K34(11.805,12.779) K35(12.805,12.779) K36(13.805,12.779) K37(14.805,12.779) K38(15.805,12.779) K39(16.805,12.779) K40(17.805,12.779) K41(18.805,12.779) K42(19.805,12.779) K43(20.805,12.779) K44(21.805,12.779) L1(-21.195,11.779) L2(-20.195,11.779) L3(-19.195,11.779) L4(-18.195,11.779) L5(-17.195,11.779) L6(-16.195,11.779) L7(-15.195,11.779) L8(-14.195,11.779) L9(-13.195,11.779) L10(-12.195,11.779) L11(-11.195,11.779) L12(-10.195,11.779) L13(-9.195,11.779) L14(-8.195,11.779) L15(-7.195,11.779) L16(-6.195,11.779) L17(-5.195,11.779) L18(-4.195,11.779) L19(-3.195,11.779) L20(-2.195,11.779) L21(-1.195,11.779) L22(-0.195,11.779) L23(0.805,11.779) L24(1.805,11.779) L25(2.805,11.779) L26(3.805,11.779) L27(4.805,11.779) L28(5.805,11.779) L29(6.805,11.779) L30(7.805,11.779) L31(8.805,11.779) L32(9.805,11.779) L33(10.805,11.779) L34(11.805,11.779) L35(12.805,11.779) L36(13.805,11.779) L37(14.805,11.779) L38(15.805,11.779) L39(16.805,11.779) L40(17.805,11.779) L41(18.805,11.779) L42(19.805,11.779) L43(20.805,11.779) L44(21.805,11.779) M1(-21.195,10.779) M2(-20.195,10.779) M3(-19.195,10.779) M4(-18.195,10.779) M5(-17.195,10.779) M6(-16.195,10.779) M7(-15.195,10.779) M8(-14.195,10.779) M9(-13.195,10.779) M10(-12.195,10.779) M11(-11.195,10.779) M12(-10.195,10.779) M13(-9.195,10.779) M14(-8.195,10.779) M15(-7.195,10.779) M16(-6.195,10.779) M17(-5.195,10.779) M18(-4.195,10.779) M19(-3.195,10.779) M20(-2.195,10.779) M21(-1.195,10.779) M22(-0.195,10.779) M23(0.805,10.779) M24(1.805,10.779) M25(2.805,10.779) M26(3.805,10.779) M27(4.805,10.779) M28(5.805,10.779) M29(6.805,10.779) M30(7.805,10.779) M31(8.805,10.779) M32(9.805,10.779) M33(10.805,10.779) M34(11.805,10.779) M35(12.805,10.779) M36(13.805,10.779) M37(14.805,10.779) M38(15.805,10.779) M39(16.805,10.779) M40(17.805,10.779) M41(18.805,10.779) M42(19.805,10.779) M43(20.805,10.779) M44(21.805,10.779) N1(-21.195,9.779) N2(-20.195,9.779) N3(-19.195,9.779) N4(-18.195,9.779) N5(-17.195,9.779) N6(-16.195,9.779) N7(-15.195,9.779) N8(-14.195,9.779) N9(-13.195,9.779) N10(-12.195,9.779) N11(-11.195,9.779) N12(-10.195,9.779) N13(-9.195,9.779) N14(-8.195,9.779) N15(-7.195,9.779) N16(-6.195,9.779) N17(-5.195,9.779) N18(-4.195,9.779) N19(-3.195,9.779) N20(-2.195,9.779) N21(-1.195,9.779) N22(-0.195,9.779) N23(0.805,9.779) N24(1.805,9.779) N25(2.805,9.779) N26(3.805,9.779) N27(4.805,9.779) N28(5.805,9.779) N29(6.805,9.779) N30(7.805,9.779) N31(8.805,9.779) N32(9.805,9.779) N33(10.805,9.779) N34(11.805,9.779) N35(12.805,9.779) N36(13.805,9.779) N37(14.805,9.779) N38(15.805,9.779) N39(16.805,9.779) N40(17.805,9.779) N41(18.805,9.779) N42(19.805,9.779) N43(20.805,9.779) N44(21.805,9.779) P1(-21.195,8.779) P2(-20.195,8.779) P3(-19.195,8.779) P4(-18.195,8.779) P5(-17.195,8.779) P6(-16.195,8.779) P7(-15.195,8.779) P8(-14.195,8.779) P9(-13.195,8.779) P10(-12.195,8.779) P11(-11.195,8.779) P12(-10.195,8.779) P13(-9.195,8.779) P14(-8.195,8.779) P15(-7.195,8.779) P16(-6.195,8.779) P17(-5.195,8.779) P18(-4.195,8.779) P19(-3.195,8.779) P20(-2.195,8.779) P21(-1.195,8.779) P22(-0.195,8.779) P23(0.805,8.779) P24(1.805,8.779) P25(2.805,8.779) P26(3.805,8.779) P27(4.805,8.779) P28(5.805,8.779) P29(6.805,8.779) P30(7.805,8.779) P31(8.805,8.779) P32(9.805,8.779) P33(10.805,8.779) P34(11.805,8.779) P35(12.805,8.779) P36(13.805,8.779) P37(14.805,8.779) P38(15.805,8.779) P39(16.805,8.779) P40(17.805,8.779) P41(18.805,8.779) P42(19.805,8.779) P43(20.805,8.779) P44(21.805,8.779) R1(-21.195,7.779) R2(-20.195,7.779) R3(-19.195,7.779) R4(-18.195,7.779) R5(-17.195,7.779) R6(-16.195,7.779) R7(-15.195,7.779) R8(-14.195,7.779) R9(-13.195,7.779) R10(-12.195,7.779) R11(-11.195,7.779) R12(-10.195,7.779) R13(-9.195,7.779) R14(-8.195,7.779) R15(-7.195,7.779) R16(-6.195,7.779) R17(-5.195,7.779) R18(-4.195,7.779) R19(-3.195,7.779) R20(-2.195,7.779) R21(-1.195,7.779) R22(-0.195,7.779) R23(0.805,7.779) R24(1.805,7.779) R25(2.805,7.779) R26(3.805,7.779) R27(4.805,7.779) R28(5.805,7.779) R29(6.805,7.779) R30(7.805,7.779) R31(8.805,7.779) R32(9.805,7.779) R33(10.805,7.779) R34(11.805,7.779) R35(12.805,7.779) R36(13.805,7.779) R37(14.805,7.779) R38(15.805,7.779) R39(16.805,7.779) R40(17.805,7.779) R41(18.805,7.779) R42(19.805,7.779) R43(20.805,7.779) R44(21.805,7.779) T1(-21.195,6.779) T2(-20.195,6.779) T3(-19.195,6.779) T4(-18.195,6.779) T5(-17.195,6.779) T6(-16.195,6.779) T7(-15.195,6.779) T8(-14.195,6.779) T9(-13.195,6.779) T10(-12.195,6.779) T11(-11.195,6.779) T12(-10.195,6.779) T13(-9.195,6.779) T14(-8.195,6.779) T15(-7.195,6.779) T16(-6.195,6.779) T17(-5.195,6.779) T18(-4.195,6.779) T19(-3.195,6.779) T20(-2.195,6.779) T21(-1.195,6.779) T22(-0.195,6.779) T23(0.805,6.779) T24(1.805,6.779) T25(2.805,6.779) T26(3.805,6.779) T27(4.805,6.779) T28(5.805,6.779) T29(6.805,6.779) T30(7.805,6.779) T31(8.805,6.779) T32(9.805,6.779) T33(10.805,6.779) T34(11.805,6.779) T35(12.805,6.779) T36(13.805,6.779) T37(14.805,6.779) T38(15.805,6.779) T39(16.805,6.779) T40(17.805,6.779) T41(18.805,6.779) T42(19.805,6.779) T43(20.805,6.779) T44(21.805,6.779) U1(-21.195,5.779) U2(-20.195,5.779) U3(-19.195,5.779) U4(-18.195,5.779) U5(-17.195,5.779) U6(-16.195,5.779) U7(-15.195,5.779) U8(-14.195,5.779) U9(-13.195,5.779) U10(-12.195,5.779) U11(-11.195,5.779) U12(-10.195,5.779) U13(-9.195,5.779) U14(-8.195,5.779) U15(-7.195,5.779) U16(-6.195,5.779) U17(-5.195,5.779) U18(-4.195,5.779) U19(-3.195,5.779) U20(-2.195,5.779) U21(-1.195,5.779) U22(-0.195,5.779) U23(0.805,5.779) U24(1.805,5.779) U25(2.805,5.779) U26(3.805,5.779) U27(4.805,5.779) U28(5.805,5.779) U29(6.805,5.779) U30(7.805,5.779) U31(8.805,5.779) U32(9.805,5.779) U33(10.805,5.779) U34(11.805,5.779) U35(12.805,5.779) U36(13.805,5.779) U37(14.805,5.779) U38(15.805,5.779) U39(16.805,5.779) U40(17.805,5.779) U41(18.805,5.779) U42(19.805,5.779) U43(20.805,5.779) U44(21.805,5.779) V1(-21.195,4.779) V2(-20.195,4.779) V3(-19.195,4.779) V4(-18.195,4.779) V5(-17.195,4.779) V6(-16.195,4.779) V7(-15.195,4.779) V8(-14.195,4.779) V9(-13.195,4.779) V10(-12.195,4.779) V11(-11.195,4.779) V12(-10.195,4.779) V13(-9.195,4.779) V14(-8.195,4.779) V15(-7.195,4.779) V16(-6.195,4.779) V17(-5.195,4.779) V18(-4.195,4.779) V19(-3.195,4.779) V20(-2.195,4.779) V21(-1.195,4.779) V22(-0.195,4.779) V23(0.805,4.779) V24(1.805,4.779) V25(2.805,4.779) V26(3.805,4.779) V27(4.805,4.779) V28(5.805,4.779) V29(6.805,4.779) V30(7.805,4.779) V31(8.805,4.779) V32(9.805,4.779) V33(10.805,4.779) V34(11.805,4.779) V35(12.805,4.779) V36(13.805,4.779) V37(14.805,4.779) V38(15.805,4.779) V39(16.805,4.779) V40(17.805,4.779) V41(18.805,4.779) V42(19.805,4.779) V43(20.805,4.779) V44(21.805,4.779) W1(-21.195,3.779) W2(-20.195,3.779) W3(-19.195,3.779) W4(-18.195,3.779) W5(-17.195,3.779) W6(-16.195,3.779) W7(-15.195,3.779) W8(-14.195,3.779) W9(-13.195,3.779) W10(-12.195,3.779) W11(-11.195,3.779) W12(-10.195,3.779) W13(-9.195,3.779) W14(-8.195,3.779) W15(-7.195,3.779) W16(-6.195,3.779) W17(-5.195,3.779) W18(-4.195,3.779) W19(-3.195,3.779) W20(-2.195,3.779) W21(-1.195,3.779) W22(-0.195,3.779) W23(0.805,3.779) W24(1.805,3.779) W25(2.805,3.779) W26(3.805,3.779) W27(4.805,3.779) W28(5.805,3.779) W29(6.805,3.779) W30(7.805,3.779) W31(8.805,3.779) W32(9.805,3.779) W33(10.805,3.779) W34(11.805,3.779) W35(12.805,3.779) W36(13.805,3.779) W37(14.805,3.779) W38(15.805,3.779) W39(16.805,3.779) W40(17.805,3.779) W41(18.805,3.779) W42(19.805,3.779) W43(20.805,3.779) W44(21.805,3.779) Y1(-21.195,2.779) Y2(-20.195,2.779) Y3(-19.195,2.779) Y4(-18.195,2.779) Y5(-17.195,2.779) Y6(-16.195,2.779) Y7(-15.195,2.779) Y8(-14.195,2.779) Y9(-13.195,2.779) Y10(-12.195,2.779) Y11(-11.195,2.779) Y12(-10.195,2.779) Y13(-9.195,2.779) Y14(-8.195,2.779) Y15(-7.195,2.779) Y16(-6.195,2.779) Y17(-5.195,2.779) Y18(-4.195,2.779) Y19(-3.195,2.779) Y20(-2.195,2.779) Y21(-1.195,2.779) Y22(-0.195,2.779) Y23(0.805,2.779) Y24(1.805,2.779) Y25(2.805,2.779) Y26(3.805,2.779) Y27(4.805,2.779) Y28(5.805,2.779) Y29(6.805,2.779) Y30(7.805,2.779) Y31(8.805,2.779) Y32(9.805,2.779) Y33(10.805,2.779) Y34(11.805,2.779) Y35(12.805,2.779) Y36(13.805,2.779) Y37(14.805,2.779) Y38(15.805,2.779) Y39(16.805,2.779) Y40(17.805,2.779) Y41(18.805,2.779) Y42(19.805,2.779) Y43(20.805,2.779) Y44(21.805,2.779)